# Altium footprint library SMD Component.PcbLib: 163 footprints (part 8 of 11)
Each footprint in its own frame and in the unit in brackets; x right, y up, seen from the top. Pads: shape width x height; smd on the part's side, far side on the other; paste and mask are expansions set on the pad; w line width, h text height; cw(c..) or ccw(c..) is an arc to the next point about the centre after c.
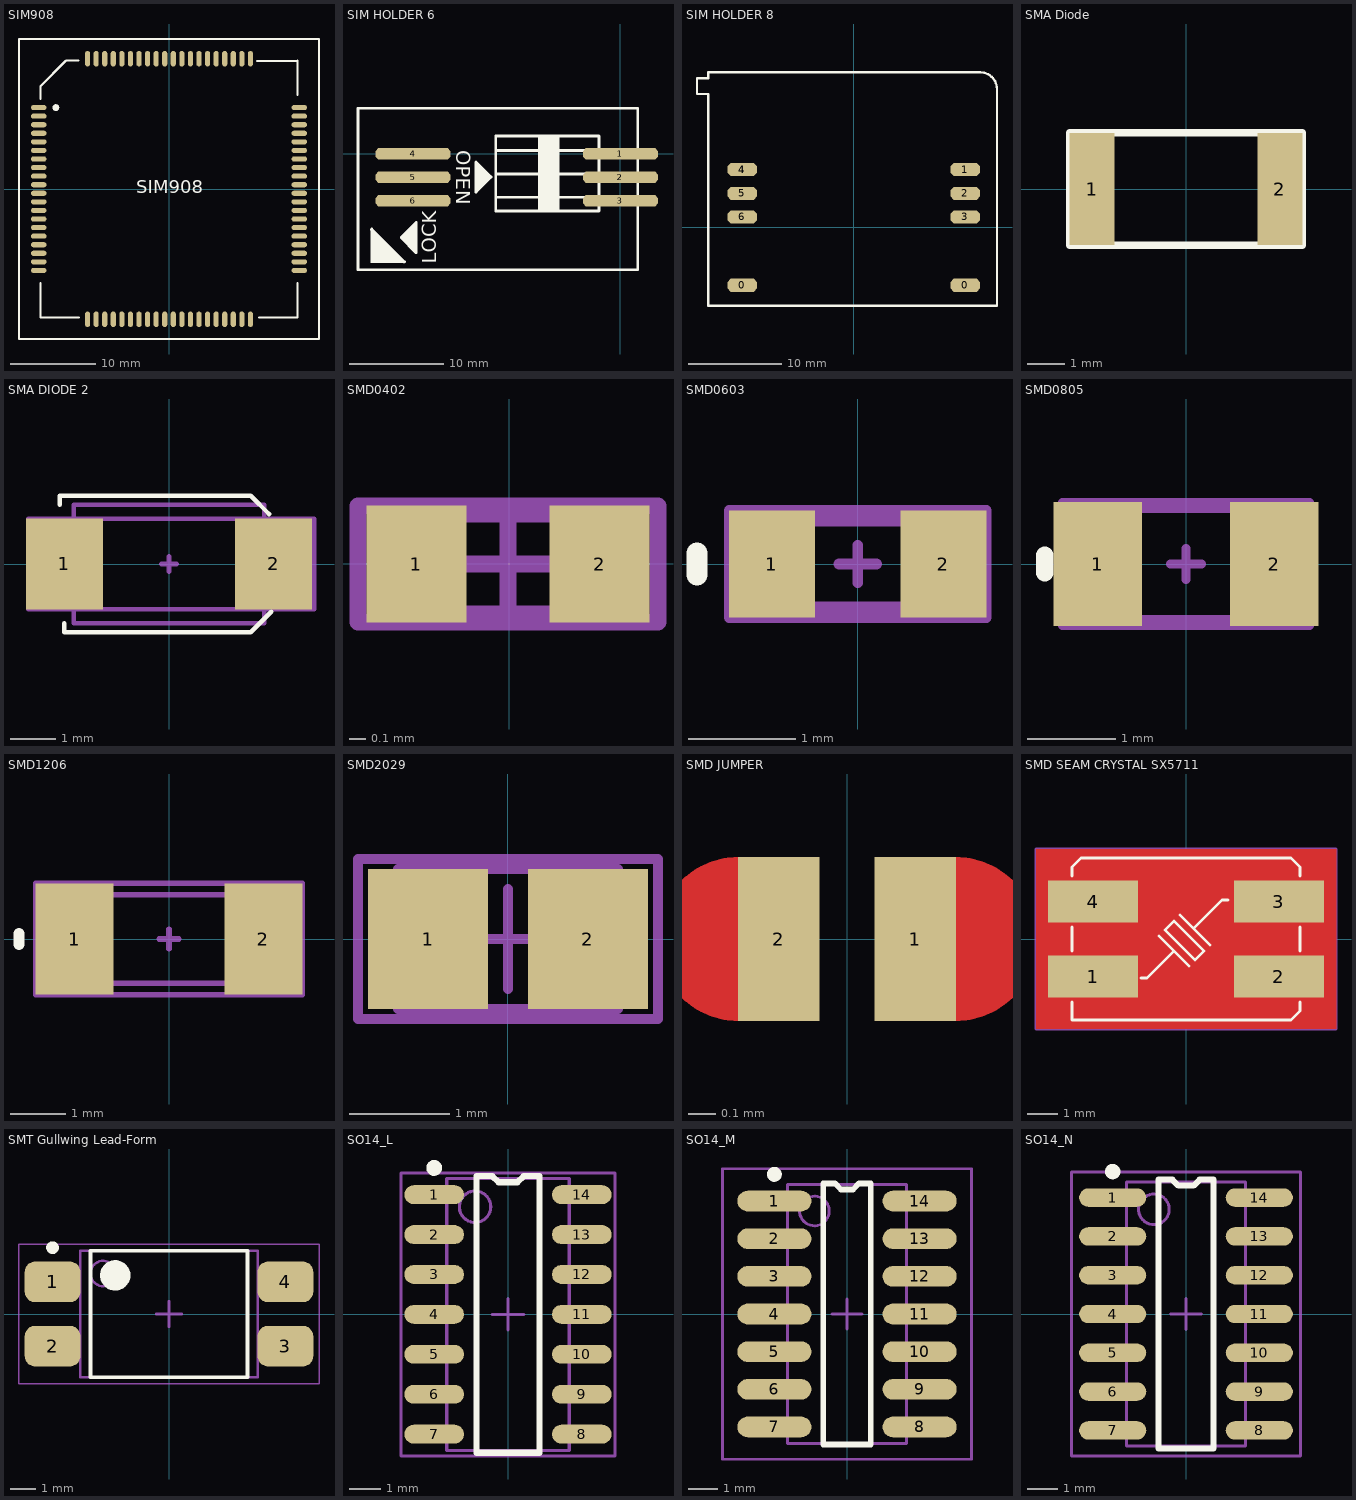
[diagram p7: the footprints below, top view; thin cyan lines are the x and y axes]

## SIM908 [mm]
pads (81):
  round 0.8 on Top Overlay: 0(-13.193,9.5)
  oval 1.8x0.6 smd: 1(-15.2,9.5) 2(-15.2,8.5) 3(-15.2,7.5) 4(-15.2,6.5) 5(-15.2,5.5) 6(-15.2,4.5) 7(-15.2,3.5) 8(-15.2,2.5) 9(-15.2,1.5) 10(-15.2,0.5) 11(-15.2,-0.5) 12(-15.2,-1.5) 13(-15.2,-2.5) 14(-15.2,-3.5) 15(-15.2,-4.5) 16(-15.2,-5.5) 17(-15.2,-6.5) 18(-15.2,-7.5) 19(-15.2,-8.5) 20(-15.2,-9.5) 41(15.2,-9.5) 42(15.2,-8.5) 43(15.2,-7.5) 44(15.2,-6.5) 45(15.2,-5.5) 46(15.2,-4.5) 47(15.2,-3.5) 48(15.2,-2.5) 49(15.2,-1.5) 50(15.2,-0.5) 51(15.2,0.5) 52(15.2,1.5) 53(15.2,2.5) 54(15.2,3.5) 55(15.2,4.5) 56(15.2,5.5) 57(15.2,6.5) 58(15.2,7.5) 59(15.2,8.5) 60(15.2,9.5)
  oval 0.6x1.8 smd: 21(-9.5,-15.2) 22(-8.5,-15.2) 23(-7.5,-15.2) 24(-6.5,-15.2) 25(-5.5,-15.2) 26(-4.5,-15.2) 27(-3.5,-15.2) 28(-2.5,-15.2) 29(-1.5,-15.2) 30(-0.5,-15.2) 31(0.5,-15.2) 32(1.5,-15.2) 33(2.5,-15.2) 34(3.5,-15.2) 35(4.5,-15.2) 36(5.5,-15.2) 37(6.5,-15.2) 38(7.5,-15.2) 39(8.5,-15.2) 40(9.5,-15.2) 61(9.5,15.2) 62(8.5,15.2) 63(7.5,15.2) 64(6.5,15.2) 65(5.5,15.2) 66(4.5,15.2) 67(3.5,15.2) 68(2.5,15.2) 69(1.5,15.2) 70(0.5,15.2) 71(-0.5,15.2) 72(-1.5,15.2) 73(-2.5,15.2) 74(-3.5,15.2) 75(-4.5,15.2) 76(-5.5,15.2) 77(-6.5,15.2) 78(-7.5,15.2) 79(-8.5,15.2) 80(-9.5,15.2)
Top Overlay:
  lines w0.254: -15,-11 -15,-15 -10.5,-15 ; -15,10.5 -15,12 -12.076,14.924 -12,14.924 -12,15 -10.576,15 ; 10.298,14.924 14.924,14.924 ; 10.5,-15 15,-15 15,-11 ; 14.924,17.5 17.5,17.5 17.5,-17.5 -17.5,-17.5 -17.5,17.5 15,17.5 ; 15,11 15,15
  text "SIM908" at -3.81,-0.508 h1.52
3D body "User Library-SIM908.STEP": height 3.09, standoff -0.11, extent -14.968,-15.042 15.032,14.958

## SIM HOLDER 6 [mm]
pads (6):
  oct 8x1.2 smd: 1(0,0) 2(0,-2.5) 3(0,-5) 4(-22.1,0) 5(-22.1,-2.5) 6(-22.1,-5)
Top Overlay:
  rectangle: -8.771,-6.14 -6.47,1.912
  rectangle: -26.638,-11.637 -23.962,-10.461
  rectangle: -26.638,-10.861 -24.962,-9.461
  rectangle: -26.638,-9.661 -25.862,-8.461
  rectangle: -24.062,-11.637 -23.262,-11.061
  rectangle: -24.162,-11.361 -23.662,-10.661
  rectangle: -23.762,-11.161 -23.562,-10.961
  rectangle: -23.262,-11.637 -23.138,-11.361
  rectangle: -25.062,-10.761 -24.462,-9.861
  rectangle: -24.562,-10.661 -24.162,-10.161
  rectangle: -25.162,-10.061 -24.838,-9.661
  rectangle: -24.838,-10.061 -24.738,-9.761
  rectangle: -26.638,-8.761 -26.162,-8.161
  rectangle: -26.162,-9.561 -25.462,-9.061
  rectangle: -26.062,-9.261 -25.662,-8.761
  rectangle: -25.862,-9.661 -25.162,-9.337
  rectangle: -25.862,-9.337 -25.338,-9.161
  rectangle: -25.862,-9.161 -25.562,-8.937
  lines w0.254: -26.538,-8.085 -26.538,-8.061 ; -26.5,-8 -22.999,-11.499 ; -23.199,-11.399 -23.062,-11.537 ; -23.1,-11.5 -23.1,-11.5
  lines w0.3: -22.8,-9.035 -22.8,-8.985 ; -22.75,-8.835 -22.45,-8.535 ; -22.65,-8.885 -22.6,-8.935 -22.6,-9.235 ; -22.55,-8.735 -22.45,-8.835 -22.45,-9.435 ; -22.35,-8.385 -22.3,-8.435 -22.3,-9.485 ; -22.1,-9.885 -23,-8.985 -23,-8.835 -21.95,-7.785 -21.95,-10.085 ; -22.1,-9.735 -22.1,-8.285 ; -15.174,-1.336 -15.174,-3.637 -14.123,-2.587 -14.123,-2.437 -15.024,-1.536 ; -15.024,-3.137 -15.024,-1.686 ; -14.824,-1.936 -14.824,-2.987 -14.774,-3.037 ; -14.673,-2.887 -14.373,-2.587 ; -14.673,-1.986 -14.673,-2.587 -14.573,-2.687 ; -14.523,-2.186 -14.523,-2.487 -14.473,-2.537 ; -14.323,-2.437 -14.323,-2.387 ; -13.289,-4.637 -2.289,-4.637 ; -13.289,-2.137 -2.289,-2.137 ; -13.289,0.364 -2.289,0.364 ; -27.962,-12.361 1.838,-12.361 1.838,4.863 -27.962,4.863 -27.962,-12.361 ; -23.35,-8.935 -21.75,-10.535 -21.75,-7.335 -23.35,-8.935 ; -15.374,-4.087 -13.773,-2.487 -15.374,-0.886 -15.374,-4.087 ; -13.289,-6.088 -2.289,-6.088 -2.289,1.912 -13.289,1.912 -13.289,-6.088
  text "OPEN" at -17.5,0.4 h1.52
  text "LOCK" at -19.6,-11.7 h1.52
3D body "User Library-SIM holder 115B-AAA0-R.STEP": height 2.35, standoff -0.7, extent -27.912,-12.361 1.788,4.839

## SIM HOLDER 8 [mm]
pads (9):
  oct 3.2x1.4 smd: 0(-11.954,-6.2) 0(11.954,-6.2) 1(11.954,6.2) 2(11.954,3.66) 3(11.954,1.12) 4(-11.954,6.2) 4(-11.954,6.2) 5(-11.954,3.66) 6(-11.954,1.12)
Top Overlay:
  lines w0.254: -15.634,14.304 -16.802,14.304 -16.802,15.981 -15.583,15.981 -15.583,16.619 13.573,16.619 cw(c13.573,14.832) 15.36,14.832 15.36,-8.381 -15.583,-8.381 -15.583,14.304
3D body "912283001.stp": height 3.1, standoff 0, extent -16.84,-8.381 15.36,16.619

## SMA Diode [mm] "SMA Package"
pads (2):
  rect 1.2x3 smd: 1(-2.5,0) 2(2.5,0)
Top Overlay:
  lines w0.2: -3.1,-1.5 3.1,-1.5 3.1,1.5 -3.1,1.5 -3.1,0 -3.1,-1.5

## SMA DIODE 2 [mm]
pads (2):
  rect 1.7x2 smd: 1(-2.3,0) 2(2.3,0)
Top Overlay:
  lines w0.1: -2.4,1.3 -2.4,1.5 1.8,1.5 2.2,1.1 ; -2.3,-1.3 -2.3,-1.5 1.8,-1.5 2.25,-1.05
Mechanical 13:
  lines w0.1: -2.1,-1.3 2.1,-1.3 2.1,1.3 -2.1,1.3 -2.1,-1.3
Mechanical 15:
  lines w0.1: -0.175,0 0.175,0 ; 0,-0.175 0,0.175 ; -3.1,-1 3.2,-1 3.2,1 -3.1,1 -3.1,-1
3D body: height 0.55, standoff 0, extent -2.1,-1.3 2.1,1.3

## SMD0402 [mm] "Chip Inductor, Body 0.4x0.2mm, IPC High Density"
pads (2):
  rect 0.6x0.7 smd: 1(-0.558,0) 2(0.542,0)
Mechanical 13:
  lines w0.1: -0.558,-0.3 -0.558,0.3 0.542,0.3 0.542,-0.3 -0.558,-0.3
Mechanical 15:
  lines w0.1: -0.308,0 0.292,0 ; -0.008,-0.3 -0.008,0.3 ; -0.908,-0.35 -0.908,0.35 0.892,0.35 0.892,-0.35 -0.908,-0.35

## SMD0603 [mm] "Chip Inductor, Body 0.6x0.3mm, IPC High Density"
height 0.55
pads (2):
  rect 0.8x1 smd: 1(-0.8,0) 2(0.8,0)
Top Overlay:
  lines w0.2: -1.5,-0.1 -1.5,0.1
Mechanical 13:
  lines w0.1: -0.8,-0.4 -0.8,0.4 0.8,0.4 0.8,-0.4 -0.8,-0.4
Mechanical 15:
  lines w0.1: -0.175,0 0.175,0 ; 0,-0.175 0,0.175 ; -1.2,-0.5 -1.2,0.5 1.2,0.5 1.2,-0.5 -1.2,-0.5
3D body: height 0.55, standoff 0, extent -0.8,-0.4 0.8,0.4

## SMD0805 [mm] "Chip Inductor, Body 0.8x0.5mm, IPC High Density"
pads (2):
  rect 1x1.4 smd: 1(-1,0) 2(1,0)
Top Overlay:
  lines w0.2: -1.6,-0.1 -1.6,0.1
Mechanical 13:
  lines w0.1: -1,-0.63 -1,0.63 1,0.63 1,-0.63 -1,-0.63
Mechanical 15:
  lines w0.1: -0.175,0 0.175,0 ; 0,-0.175 0,0.175 ; -1.4,-0.7 -1.4,0.7 1.4,0.7 1.4,-0.7 -1.4,-0.7
3D body: height 0.55, standoff 0, extent -1,-0.63 1,0.63

## SMD1206 [mm] "Chip Inductor, Body 12x0.6mm, IPC High Density"
pads (2):
  rect 1.4x2 smd: 1(-1.7,0) 2(1.7,0)
Top Overlay:
  lines w0.2: -2.7,-0.1 -2.7,0.1
Mechanical 13:
  lines w0.1: -1.6,-0.8 1.6,-0.8 1.6,0.8 -1.6,0.8 -1.6,-0.8
Mechanical 15:
  lines w0.1: -0.175,0 0.175,0 ; 0,-0.175 0,0.175 ; -2.4,-1 2.4,-1 2.4,1 -2.4,1 -2.4,-1
3D body: height 0.55, standoff 0, extent -1.6,-0.8 1.6,0.8

## SMD2029 [mm] "Chip Inductor, Body 2.0x1.2mm, IPC High Density"
height 0.55
pads (2):
  rect 1.2x1.4 smd: 1(-0.8,0) 2(0.8,0)
Mechanical 13:
  lines w0.1: -1.1,-0.7 1.1,-0.7 1.1,0.7 -1.1,0.7 -1.1,-0.7
Mechanical 15:
  lines w0.1: -0.5,0 0.5,0 ; 0,-0.5 0,0.5 ; -1.5,-0.8 1.5,-0.8 1.5,0.8 -1.5,0.8 -1.5,-0.8

## SMD JUMPER [mm]
pads (2):
  rect 0.3x0.6 smd: 1(0.25,0) 2(-0.25,0)
Top Layer:
  lines w0.3: -0.4,-0.15 cw(c-0.4,0) -0.4,0.15 ; 0.4,-0.15 ccw(c0.4,0) 0.4,0.15

## SMD SEAM CRYSTAL SX5711 [mm] "High frequency stability and reliability.DESIGNER ABBAS BASEREH"
height 1.2
pads (4):
  rect 3x1.4 smd: 1(-3.1,-1.25) 2(3.1,-1.25) 3(3.1,1.25) 4(-3.1,1.25)
Top Layer:
  pour cut-out: -5,3 -5,-3 5,-3 5,3
Top Overlay:
  lines w0.1: -3.8,-2.1 -3.8,-2.7 3.5,-2.7 3.8,-2.4 3.8,-2.1 ; -3.8,-0.4 -3.8,0.4 ; -3.8,2.1 -3.8,2.4 -3.5,2.7 3.5,2.7 3.8,2.4 3.8,2.1 ; -1.5,-1.3 -1.3,-1.3 -0.4,-0.4 ; -0.9,0.1 0.1,-0.9 ; -0.2,0.8 0.8,-0.2 ; 0.3,0.4 1.2,1.3 1.4,1.3 ; 3.8,-0.4 3.8,0.4 ; -0.7,0.3 0.3,-0.7 0.6,-0.4 ; -0.7,0.3 -0.7,0.3 ; -0.7,0.3 -0.4,0.6 0.6,-0.4 ; 0.6,-0.4 0.6,-0.4
Mechanical 15:
  lines w0.1: -0.5,0 0.5,0 ; 0,-0.5 0,0.5 ; -5,-3 -5,3 5,3 5,-3 -5,-3
3D body "User Library-KX-13 7_0x5_0x1_3.STEP": height 1.3, standoff 0, extent -3.525,-2.5 3.475,2.5

## SMT Gullwing Lead-Form [mm] "SOP, 4-Leads, Body 4/65x6/75mm, Pitch 2/54mm, IPC Medium Density designer:abbas basereh"
height 3.5
pads (4):
  rrect50% 2.2x1.6 smd mask+0.06: 1(-4.6,1.27) 2(-4.6,-1.27) 3(4.6,-1.27) 4(4.6,1.27)
Top Overlay:
  circle w0.25: c-4.6,2.62 r0.125
  circle w0.6: c-2.125,1.525 r0.3
  lines w0.15: -3.1,-2.5 -3.1,2.5 3.1,2.5 3.1,-2.5 -3.1,-2.5
Mechanical 13:
  circle w0.1: c-2.6,1.6 r0.5
  lines w0.1: -3.5,-2.5 -3.5,2.5 3.5,2.5 3.5,-2.5 -3.5,-2.5
Mechanical 15:
  lines w0.05: -5.925,-2.75 -5.925,2.75 5.925,2.75 5.925,-2.75 -5.925,-2.75
  lines w0.1: -0.5,0 0.5,0 ; 0,-0.5 0,0.5
3D body "User Library-PC817_Gullwing.STEP": height 3.89, standoff 0.04, extent -5,-2.29 5,2.29

## SO14_L [mm] "14-Pin Small Outline Integrated Circuit 1.27 mm Pitch, IPC High Density - Designer Abbas Basereh"
height 1.75
pads (14):
  oval 1.9x0.6 smd: 1(-2.35,3.81) 2(-2.35,2.54) 3(-2.35,1.27) 4(-2.35,0) 5(-2.35,-1.27) 6(-2.35,-2.54) 7(-2.35,-3.81) 8(2.35,-3.81) 9(2.35,-2.54) 10(2.35,-1.27) 11(2.35,0) 12(2.35,1.27) 13(2.35,2.54) 14(2.35,3.81)
Top Overlay:
  circle w0.25: c-2.35,4.66 r0.125
  lines w0.2: -1,-4.4 1,-4.4 1,4.4 0.5,4.4 0.3,4.2 -0.3,4.2 -0.5,4.4 -1,4.4 -1,-4.4
Mechanical 13:
  circle w0.1: c-1.05,3.425 r0.5
  lines w0.1: -1.95,-4.325 1.95,-4.325 1.95,4.325 -1.95,4.325 -1.95,-4.325
Mechanical 15:
  lines w0.1: -0.5,0 0.5,0 ; 0,-0.5 0,0.5 ; -3.4,-4.5 3.4,-4.5 3.4,4.5 -3.4,4.5 -3.4,-4.5
3D body "User Library-SO-14N.STEP": height 1.62, standoff 0, extent -3,-4.34 3,4.34

## SO14_M [mm] "14-Pin Small Outline Integrated Circuit 1.27 mm Pitch, IPC Low Density - Designer Abbas Basereh"
height 1.75
pads (14):
  oval 2.5x0.7 smd: 1(-2.45,3.81) 2(-2.45,2.54) 3(-2.45,1.27) 4(-2.45,0) 5(-2.45,-1.27) 6(-2.45,-2.54) 7(-2.45,-3.81) 8(2.45,-3.81) 9(2.45,-2.54) 10(2.45,-1.27) 11(2.45,0) 12(2.45,1.27) 13(2.45,2.54) 14(2.45,3.81)
Top Overlay:
  circle w0.25: c-2.45,4.71 r0.125
  lines w0.2: -0.8,-4.4 -0.8,4.4 -0.4,4.4 -0.2,4.2 0.2,4.2 0.4,4.4 0.8,4.4 0.8,-4.4 -0.8,-4.4
Mechanical 13:
  circle w0.1: c-1.1,3.475 r0.5
  lines w0.1: -2,-4.375 -2,4.375 2,4.375 2,-4.375 -2,-4.375
Mechanical 15:
  lines w0.1: -0.5,0 0.5,0 ; 0,-0.5 0,0.5 ; -4.2,-4.9 -4.2,4.9 4.2,4.9 4.2,-4.9 -4.2,-4.9
3D body "User Library-SO-14N.STEP": height 1.62, standoff 0, extent -3,-4.34 3,4.34

## SO14_N [mm] "14-Pin Small Outline Integrated Circuit 1.27 mm Pitch, IPC Medium Density - Designer Abbas Basereh"
height 1.75
pads (14):
  oval 2.2x0.6 smd: 1(-2.4,3.81) 2(-2.4,2.54) 3(-2.4,1.27) 4(-2.4,0) 5(-2.4,-1.27) 6(-2.4,-2.54) 7(-2.4,-3.81) 8(2.4,-3.81) 9(2.4,-2.54) 10(2.4,-1.27) 11(2.4,0) 12(2.4,1.27) 13(2.4,2.54) 14(2.4,3.81)
Top Overlay:
  circle w0.25: c-2.4,4.66 r0.125
  lines w0.2: -0.9,-4.4 0.9,-4.4 0.9,4.4 0.45,4.4 0.25,4.2 -0.25,4.2 -0.45,4.4 -0.9,4.4 -0.9,-4.4
Mechanical 13:
  circle w0.1: c-1.05,3.425 r0.5
  lines w0.1: -1.95,-4.325 1.95,-4.325 1.95,4.325 -1.95,4.325 -1.95,-4.325
Mechanical 15:
  lines w0.1: -0.5,0 0.5,0 ; 0,-0.5 0,0.5 ; -3.75,-4.65 3.75,-4.65 3.75,4.65 -3.75,4.65 -3.75,-4.65
3D body "User Library-SO-14N.STEP": height 1.62, standoff 0, extent -3,-4.34 3,4.34